# Altium footprint library WE-SHC.PcbLib: 139 footprints (part 5 of 10) (continued)
## 3670448 [mm] "Shielding Cabinet, SMT Frame Seamless, 44.8x18.2x3mm"
height 3
pads (6):
  rect 1x15 smd paste-2539.97 mask-2222: 1(-22.25,0) 1(22.25,0)
  oval 1.5x2.5 hole 0.9 slot 1.7 at 90 deg: 1(-22.25,0) 1(22.25,0)
  rect 20x1 smd paste-2539.97 mask-2222: 1(0,-8.95) 1(0,8.95)
Top Layer:
  region: -23,-7.3 -23,7.3 -23,7.536 -22.908,8 -22.727,8.437 -22.464,8.83 -22.13,9.164 -21.737,9.427 -21.3,9.608 -20.836,9.7 -20.6,9.7 1,9.7 1,8.2 -20.6,8.2 -20.688,8.196 -20.861,8.161 -21.024,8.094 -21.171,7.996 -21.296,7.871 -21.394,7.724 -21.461,7.561 -21.496,7.388 -21.5,7.3 -21.5,-7.3 -21.496,-7.388 -21.461,-7.561 -21.394,-7.724 -21.296,-7.871 -21.171,-7.996 -21.024,-8.094 -20.861,-8.161 -20.688,-8.196 -20.6,-8.2 1,-8.2 1,-9.7 -20.6,-9.7 -20.836,-9.7 -21.3,-9.608 -21.737,-9.427 -22.13,-9.164 -22.464,-8.83 -22.727,-8.437 -22.908,-8 -23,-7.536
  region: 23,-7.3 23,7.3 23,7.536 22.908,8 22.727,8.437 22.464,8.83 22.13,9.164 21.737,9.427 21.3,9.608 20.836,9.7 20.6,9.7 0.25,9.7 0.25,8.2 20.6,8.2 20.688,8.196 20.861,8.161 21.024,8.094 21.171,7.996 21.296,7.871 21.394,7.724 21.461,7.561 21.496,7.388 21.5,7.3 21.5,-7.3 21.496,-7.388 21.461,-7.561 21.394,-7.724 21.296,-7.871 21.171,-7.996 21.024,-8.094 20.861,-8.161 20.688,-8.196 20.6,-8.2 0.25,-8.2 0.25,-9.7 20.6,-9.7 20.836,-9.7 21.3,-9.608 21.737,-9.427 22.13,-9.164 22.464,-8.83 22.727,-8.437 22.908,-8 23,-7.536
Top Paste:
  region: 23,-7.3 23,7.3 23,7.536 22.908,8 22.727,8.437 22.464,8.83 22.13,9.164 21.737,9.427 21.3,9.608 20.836,9.7 20.6,9.7 0.25,9.7 0.25,8.2 20.6,8.2 20.688,8.196 20.861,8.161 21.024,8.094 21.171,7.996 21.296,7.871 21.394,7.724 21.461,7.561 21.496,7.388 21.5,7.3 21.5,-7.3 21.496,-7.388 21.461,-7.561 21.394,-7.724 21.296,-7.871 21.171,-7.996 21.024,-8.094 20.861,-8.161 20.688,-8.196 20.6,-8.2 0.25,-8.2 0.25,-9.7 20.6,-9.7 20.836,-9.7 21.3,-9.608 21.737,-9.427 22.13,-9.164 22.464,-8.83 22.727,-8.437 22.908,-8 23,-7.536
  region: -23,-7.3 -23,7.3 -23,7.536 -22.908,8 -22.727,8.437 -22.464,8.83 -22.13,9.164 -21.737,9.427 -21.3,9.608 -20.836,9.7 -20.6,9.7 -0.25,9.7 -0.25,8.2 -20.6,8.2 -20.688,8.196 -20.861,8.161 -21.024,8.094 -21.171,7.996 -21.296,7.871 -21.394,7.724 -21.461,7.561 -21.496,7.388 -21.5,7.3 -21.5,-7.3 -21.496,-7.388 -21.461,-7.561 -21.394,-7.724 -21.296,-7.871 -21.171,-7.996 -21.024,-8.094 -20.861,-8.161 -20.688,-8.196 -20.6,-8.2 -0.25,-8.2 -0.25,-9.7 -20.6,-9.7 -20.836,-9.7 -21.3,-9.608 -21.737,-9.427 -22.13,-9.164 -22.464,-8.83 -22.727,-8.437 -22.908,-8 -23,-7.536
Notes:
  text "recommended tin paste thickness=0.5mm / customer to define the final stencil gap" at -6.35,-11.5 h0.4
Top Designator:
  text ".Designator" at -7.498,-0.5 h1.5
Top Component Outline:
  lines w0.1: -22.4,-7.35 ccw(c-20.65,-7.35) -20.65,-9.1 20.65,-9.1 ccw(c20.65,-7.35) 22.4,-7.35 22.4,7.35 ccw(c20.65,7.35) 20.65,9.1 -20.65,9.1 ccw(c-20.65,7.35) -22.4,7.35 -22.4,-7.35
Top 3D Body:
  lines w0.1: -22.4,-7.35 ccw(c-20.65,-7.35) -20.65,-9.1 20.65,-9.1 ccw(c20.65,-7.35) 22.4,-7.35 22.4,7.35 ccw(c20.65,7.35) 20.65,9.1 -20.65,9.1 ccw(c-20.65,7.35) -22.4,7.35 -22.4,-7.35
Top Courtyard:
  lines w0.05: -0.5,0 0.5,0 ; 0,-0.5 0,0.5 ; -23.2,-9.9 -23.2,9.9 23.2,9.9 23.2,-9.9 -23.2,-9.9
3D body "3670448.stp": height 3, standoff -0.5, extent -22.4,-9.1 22.4,9.1

## 3670453 [mm] "Shielding Cabinet, SMT Frame Seamless, 45.3x16.2x6mm"
height 6
pads (6):
  rect 1x14 smd paste-2539.97 mask-2222: 1(-22.5,0) 1(22.5,0)
  oval 1.5x2.7 hole 0.8 slot 1.8 at 90 deg: 1(-22.5,0) 1(22.5,0)
  rect 20x1 smd paste-2539.97 mask-2222: 1(0,-7.95) 1(0,7.95)
Top Layer:
  region: -23.25,-6.3 -23.25,6.3 -23.25,6.536 -23.158,7 -22.977,7.437 -22.714,7.83 -22.38,8.164 -21.987,8.427 -21.55,8.608 -21.086,8.7 -20.85,8.7 1,8.7 1,7.2 -20.85,7.2 -20.938,7.196 -21.111,7.161 -21.274,7.094 -21.421,6.996 -21.546,6.871 -21.644,6.724 -21.711,6.561 -21.746,6.388 -21.75,6.3 -21.75,-6.3 -21.746,-6.388 -21.711,-6.561 -21.644,-6.724 -21.546,-6.871 -21.421,-6.996 -21.274,-7.094 -21.111,-7.161 -20.938,-7.196 -20.85,-7.2 1,-7.2 1,-8.7 -20.85,-8.7 -21.086,-8.7 -21.55,-8.608 -21.987,-8.427 -22.38,-8.164 -22.714,-7.83 -22.977,-7.437 -23.158,-7 -23.25,-6.536
  region: 23.25,-6.3 23.25,6.3 23.25,6.536 23.158,7 22.977,7.437 22.714,7.83 22.38,8.164 21.987,8.427 21.55,8.608 21.086,8.7 20.85,8.7 0.25,8.7 0.25,7.2 20.85,7.2 20.938,7.196 21.111,7.161 21.274,7.094 21.421,6.996 21.546,6.871 21.644,6.724 21.711,6.561 21.746,6.388 21.75,6.3 21.75,-6.3 21.746,-6.388 21.711,-6.561 21.644,-6.724 21.546,-6.871 21.421,-6.996 21.274,-7.094 21.111,-7.161 20.938,-7.196 20.85,-7.2 0.25,-7.2 0.25,-8.7 20.85,-8.7 21.086,-8.7 21.55,-8.608 21.987,-8.427 22.38,-8.164 22.714,-7.83 22.977,-7.437 23.158,-7 23.25,-6.536
Top Paste:
  region: 23.25,-6.3 23.25,6.3 23.25,6.536 23.158,7 22.977,7.437 22.714,7.83 22.38,8.164 21.987,8.427 21.55,8.608 21.086,8.7 20.85,8.7 0.25,8.7 0.25,7.2 20.85,7.2 20.938,7.196 21.111,7.161 21.274,7.094 21.421,6.996 21.546,6.871 21.644,6.724 21.711,6.561 21.746,6.388 21.75,6.3 21.75,-6.3 21.746,-6.388 21.711,-6.561 21.644,-6.724 21.546,-6.871 21.421,-6.996 21.274,-7.094 21.111,-7.161 20.938,-7.196 20.85,-7.2 0.25,-7.2 0.25,-8.7 20.85,-8.7 21.086,-8.7 21.55,-8.608 21.987,-8.427 22.38,-8.164 22.714,-7.83 22.977,-7.437 23.158,-7 23.25,-6.536
  region: -23.25,-6.3 -23.25,6.3 -23.25,6.536 -23.158,7 -22.977,7.437 -22.714,7.83 -22.38,8.164 -21.987,8.427 -21.55,8.608 -21.086,8.7 -20.85,8.7 -0.25,8.7 -0.25,7.2 -20.85,7.2 -20.938,7.196 -21.111,7.161 -21.274,7.094 -21.421,6.996 -21.546,6.871 -21.644,6.724 -21.711,6.561 -21.746,6.388 -21.75,6.3 -21.75,-6.3 -21.746,-6.388 -21.711,-6.561 -21.644,-6.724 -21.546,-6.871 -21.421,-6.996 -21.274,-7.094 -21.111,-7.161 -20.938,-7.196 -20.85,-7.2 -0.25,-7.2 -0.25,-8.7 -20.85,-8.7 -21.086,-8.7 -21.55,-8.608 -21.987,-8.427 -22.38,-8.164 -22.714,-7.83 -22.977,-7.437 -23.158,-7 -23.25,-6.536
Notes:
  text "recommended tin paste thickness=0.5mm / customer to define the final stencil gap" at -6.2,-10.25 h0.4
Top Designator:
  text ".Designator" at -7.498,-0.5 h1.5
Top Component Outline:
  lines w0.1: -22.65,-6.35 ccw(c-20.9,-6.35) -20.9,-8.1 20.9,-8.1 ccw(c20.9,-6.35) 22.65,-6.35 22.65,6.35 ccw(c20.9,6.35) 20.9,8.1 -20.9,8.1 ccw(c-20.9,6.35) -22.65,6.35 -22.65,-6.35
Top 3D Body:
  lines w0.1: -22.65,-6.35 ccw(c-20.9,-6.35) -20.9,-8.1 20.9,-8.1 ccw(c20.9,-6.35) 22.65,-6.35 22.65,6.35 ccw(c20.9,6.35) 20.9,8.1 -20.9,8.1 ccw(c-20.9,6.35) -22.65,6.35 -22.65,-6.35
Top Courtyard:
  lines w0.05: -0.5,0 0.5,0 ; 0,-0.5 0,0.5 ; -23.45,-8.9 -23.45,8.9 23.45,8.9 23.45,-8.9 -23.45,-8.9
3D body "3670453.stp": height 6, standoff -1, extent -22.65,-8.1 22.65,8.1

## 3670466 [mm] "Shielding Cabinet, SMT Frame Seamless, 46.6x17.3x5mm"
height 5
pads (4):
  rect 1x14 smd paste-2539.97 mask-2222: 1(-23.15,0) 1(23.15,0)
  rect 20x1 smd paste-2539.97 mask-2222: 1(0,-8.5) 1(0,8.5)
Top Layer:
  region: -23.9,-1 -23.9,6.65 -23.9,6.906 -23.8,7.408 -23.604,7.882 -23.32,8.307 -22.957,8.67 -22.532,8.954 -22.058,9.15 -21.556,9.25 -21.3,9.25 21.3,9.25 21.556,9.25 22.058,9.15 22.532,8.954 22.957,8.67 23.32,8.307 23.604,7.882 23.8,7.408 23.9,6.906 23.9,6.65 23.9,-1 22.4,-1 22.4,6.65 22.395,6.758 22.353,6.969 22.27,7.169 22.15,7.348 21.998,7.5 21.819,7.62 21.619,7.703 21.408,7.745 21.3,7.75 -21.3,7.75 -21.408,7.745 -21.619,7.703 -21.819,7.62 -21.998,7.5 -22.15,7.348 -22.27,7.169 -22.353,6.969 -22.395,6.758 -22.4,6.65 -22.4,-1
  region: -23.9,-0.25 -23.9,-6.65 -23.9,-6.906 -23.8,-7.408 -23.604,-7.882 -23.32,-8.307 -22.957,-8.67 -22.532,-8.954 -22.058,-9.15 -21.556,-9.25 -21.3,-9.25 21.3,-9.25 21.556,-9.25 22.058,-9.15 22.532,-8.954 22.957,-8.67 23.32,-8.307 23.604,-7.882 23.8,-7.408 23.9,-6.906 23.9,-6.65 23.9,-0.25 22.4,-0.25 22.4,-6.65 22.395,-6.758 22.353,-6.969 22.27,-7.169 22.15,-7.348 21.998,-7.5 21.819,-7.62 21.619,-7.703 21.408,-7.745 21.3,-7.75 -21.3,-7.75 -21.408,-7.745 -21.619,-7.703 -21.819,-7.62 -21.998,-7.5 -22.15,-7.348 -22.27,-7.169 -22.353,-6.969 -22.395,-6.758 -22.4,-6.65 -22.4,-0.25
Top Paste:
  region: -23.9,-0.25 -23.9,-6.65 -23.9,-6.906 -23.8,-7.408 -23.604,-7.882 -23.32,-8.307 -22.957,-8.67 -22.532,-8.954 -22.058,-9.15 -21.556,-9.25 -21.3,-9.25 21.3,-9.25 21.556,-9.25 22.058,-9.15 22.532,-8.954 22.957,-8.67 23.32,-8.307 23.604,-7.882 23.8,-7.408 23.9,-6.906 23.9,-6.65 23.9,-0.25 22.4,-0.25 22.4,-6.65 22.395,-6.758 22.353,-6.969 22.27,-7.169 22.15,-7.348 21.998,-7.5 21.819,-7.62 21.619,-7.703 21.408,-7.745 21.3,-7.75 -21.3,-7.75 -21.408,-7.745 -21.619,-7.703 -21.819,-7.62 -21.998,-7.5 -22.15,-7.348 -22.27,-7.169 -22.353,-6.969 -22.395,-6.758 -22.4,-6.65 -22.4,-0.25
  region: -23.9,0.25 -23.9,6.65 -23.9,6.906 -23.8,7.408 -23.604,7.882 -23.32,8.307 -22.957,8.67 -22.532,8.954 -22.058,9.15 -21.556,9.25 -21.3,9.25 21.3,9.25 21.556,9.25 22.058,9.15 22.532,8.954 22.957,8.67 23.32,8.307 23.604,7.882 23.8,7.408 23.9,6.906 23.9,6.65 23.9,0.25 22.4,0.25 22.4,6.65 22.395,6.758 22.353,6.969 22.27,7.169 22.15,7.348 21.998,7.5 21.819,7.62 21.619,7.703 21.408,7.745 21.3,7.75 -21.3,7.75 -21.408,7.745 -21.619,7.703 -21.819,7.62 -21.998,7.5 -22.15,7.348 -22.27,7.169 -22.353,6.969 -22.395,6.758 -22.4,6.65 -22.4,0.25
Notes:
  text "recommended tin paste thickness=0.5mm / customer to define the final stencil gap" at -6.25,-10.9 h0.4
Top Designator:
  text ".Designator" at -7.498,-0.5 h1.5
Top Component Outline:
  lines w0.1: -23.3,-6.65 ccw(c-21.3,-6.65) -21.3,-8.65 21.3,-8.65 ccw(c21.3,-6.65) 23.3,-6.65 23.3,6.65 ccw(c21.3,6.65) 21.3,8.65 -21.3,8.65 ccw(c-21.3,6.65) -23.3,6.65 -23.3,-6.65
Top 3D Body:
  lines w0.1: -23.3,-6.65 ccw(c-21.3,-6.65) -21.3,-8.65 21.3,-8.65 ccw(c21.3,-6.65) 23.3,-6.65 23.3,6.65 ccw(c21.3,6.65) 21.3,8.65 -21.3,8.65 ccw(c-21.3,6.65) -23.3,6.65 -23.3,-6.65
Top Courtyard:
  lines w0.05: -0.5,0 0.5,0 ; 0,-0.5 0,0.5 ; -24.1,-9.45 24.1,-9.45 24.1,9.45 -24.1,9.45 -24.1,-9.45
3D body "3670466.stp": height 5, standoff 0, extent -23.3,-8.65 23.3,8.65

## 3670473 [mm] "Shielding Cabinet, SMT Frame Seamless, 47.3x23.3x5.3mm"
height 5.3
pads (4):
  rect 1x20 smd paste-2539.97 mask-2222: 1(-23.5,0) 1(23.5,0)
  rect 20x1 smd paste-2539.97 mask-2222: 1(0,-11.5) 1(0,11.5)
Top Layer:
  region: -24.25,-0.25 -24.25,-9.65 -24.25,-9.906 -24.15,-10.408 -23.954,-10.882 -23.67,-11.307 -23.307,-11.67 -22.882,-11.954 -22.408,-12.15 -21.906,-12.25 -21.65,-12.25 21.65,-12.25 21.906,-12.25 22.408,-12.15 22.882,-11.954 23.307,-11.67 23.67,-11.307 23.954,-10.882 24.15,-10.408 24.25,-9.906 24.25,-9.65 24.25,-0.25 22.75,-0.25 22.75,-9.65 22.745,-9.758 22.703,-9.969 22.62,-10.169 22.5,-10.348 22.348,-10.5 22.169,-10.62 21.969,-10.703 21.758,-10.745 21.65,-10.75 -21.65,-10.75 -21.758,-10.745 -21.969,-10.703 -22.169,-10.62 -22.348,-10.5 -22.5,-10.348 -22.62,-10.169 -22.703,-9.969 -22.745,-9.758 -22.75,-9.65 -22.75,-0.25
  region: -24.25,-1 -24.25,9.65 -24.25,9.906 -24.15,10.408 -23.954,10.882 -23.67,11.307 -23.307,11.67 -22.882,11.954 -22.408,12.15 -21.906,12.25 -21.65,12.25 21.65,12.25 21.906,12.25 22.408,12.15 22.882,11.954 23.307,11.67 23.67,11.307 23.954,10.882 24.15,10.408 24.25,9.906 24.25,9.65 24.25,-1 22.75,-1 22.75,9.65 22.745,9.758 22.703,9.969 22.62,10.169 22.5,10.348 22.348,10.5 22.169,10.62 21.969,10.703 21.758,10.745 21.65,10.75 -21.65,10.75 -21.758,10.745 -21.969,10.703 -22.169,10.62 -22.348,10.5 -22.5,10.348 -22.62,10.169 -22.703,9.969 -22.745,9.758 -22.75,9.65 -22.75,-1
Top Paste:
  region: -24.25,0.25 -24.25,9.65 -24.25,9.906 -24.15,10.408 -23.954,10.882 -23.67,11.307 -23.307,11.67 -22.882,11.954 -22.408,12.15 -21.906,12.25 -21.65,12.25 21.65,12.25 21.906,12.25 22.408,12.15 22.882,11.954 23.307,11.67 23.67,11.307 23.954,10.882 24.15,10.408 24.25,9.906 24.25,9.65 24.25,0.25 22.75,0.25 22.75,9.65 22.745,9.758 22.703,9.969 22.62,10.169 22.5,10.348 22.348,10.5 22.169,10.62 21.969,10.703 21.758,10.745 21.65,10.75 -21.65,10.75 -21.758,10.745 -21.969,10.703 -22.169,10.62 -22.348,10.5 -22.5,10.348 -22.62,10.169 -22.703,9.969 -22.745,9.758 -22.75,9.65 -22.75,0.25
  region: -24.25,-0.25 -24.25,-9.65 -24.25,-9.906 -24.15,-10.408 -23.954,-10.882 -23.67,-11.307 -23.307,-11.67 -22.882,-11.954 -22.408,-12.15 -21.906,-12.25 -21.65,-12.25 21.65,-12.25 21.906,-12.25 22.408,-12.15 22.882,-11.954 23.307,-11.67 23.67,-11.307 23.954,-10.882 24.15,-10.408 24.25,-9.906 24.25,-9.65 24.25,-0.25 22.75,-0.25 22.75,-9.65 22.745,-9.758 22.703,-9.969 22.62,-10.169 22.5,-10.348 22.348,-10.5 22.169,-10.62 21.969,-10.703 21.758,-10.745 21.65,-10.75 -21.65,-10.75 -21.758,-10.745 -21.969,-10.703 -22.169,-10.62 -22.348,-10.5 -22.5,-10.348 -22.62,-10.169 -22.703,-9.969 -22.745,-9.758 -22.75,-9.65 -22.75,-0.25
Notes:
  text "recommended tin paste thickness=0.5mm / customer to define the final stencil gap" at -5.85,-13.9 h0.4
Top Designator:
  text ".Designator" at -7.498,-0.5 h1.5
Top Component Outline:
  lines w0.1: -23.65,-9.65 ccw(c-21.65,-9.65) -21.65,-11.65 21.65,-11.65 ccw(c21.65,-9.65) 23.65,-9.65 23.65,9.65 ccw(c21.65,9.65) 21.65,11.65 -21.65,11.65 ccw(c-21.65,9.65) -23.65,9.65 -23.65,-9.65
Top 3D Body:
  lines w0.1: -23.65,-9.65 ccw(c-21.65,-9.65) -21.65,-11.65 21.65,-11.65 ccw(c21.65,-9.65) 23.65,-9.65 23.65,9.65 ccw(c21.65,9.65) 21.65,11.65 -21.65,11.65 ccw(c-21.65,9.65) -23.65,9.65 -23.65,-9.65
Top Courtyard:
  lines w0.05: -0.5,0 0.5,0 ; 0,-0.5 0,0.5 ; -24.45,-12.45 24.45,-12.45 24.45,12.45 -24.45,12.45 -24.45,-12.45
3D body "3670473.stp": height 5.3, standoff 0, extent -23.65,-11.65 23.65,11.65

## 3670477 [mm] "Shielding Cabinet, SMT Frame Seamless, 47.7x18.2x4mm"
height 4
pads (6):
  rect 1x15 smd paste-2539.97 mask-2222: 1(-23.7,0) 1(23.7,0)
  oval 2.4x1.5 hole 0.8 slot 1.6 at 0 deg: 1(-11.45,8.95) 1(11.45,-8.95)
  rect 20x1 smd paste-2539.97 mask-2222: 1(0,-8.95) 1(0,8.95)
Top Layer:
  region: -24.45,-1 -24.45,7.5 -24.45,7.717 -24.365,8.142 -24.2,8.542 -23.959,8.902 -23.652,9.209 -23.292,9.45 -22.892,9.615 -22.467,9.7 -22.25,9.7 22.25,9.7 22.467,9.7 22.892,9.615 23.292,9.45 23.652,9.209 23.959,8.902 24.2,8.542 24.365,8.142 24.45,7.717 24.45,7.5 24.45,-1 22.95,-1 22.95,7.5 22.947,7.569 22.92,7.703 22.867,7.83 22.791,7.944 22.694,8.041 22.58,8.117 22.453,8.17 22.319,8.197 22.25,8.2 -22.25,8.2 -22.319,8.197 -22.453,8.17 -22.58,8.117 -22.694,8.041 -22.791,7.944 -22.867,7.83 -22.92,7.703 -22.947,7.569 -22.95,7.5 -22.95,-1
  region: -24.45,-0.25 -24.45,-7.5 -24.45,-7.717 -24.365,-8.142 -24.2,-8.542 -23.959,-8.902 -23.652,-9.209 -23.292,-9.45 -22.892,-9.615 -22.467,-9.7 -22.25,-9.7 22.25,-9.7 22.467,-9.7 22.892,-9.615 23.292,-9.45 23.652,-9.209 23.959,-8.902 24.2,-8.542 24.365,-8.142 24.45,-7.717 24.45,-7.5 24.45,-0.25 22.95,-0.25 22.95,-7.5 22.947,-7.569 22.92,-7.703 22.867,-7.83 22.791,-7.944 22.694,-8.041 22.58,-8.117 22.453,-8.17 22.319,-8.197 22.25,-8.2 -22.25,-8.2 -22.319,-8.197 -22.453,-8.17 -22.58,-8.117 -22.694,-8.041 -22.791,-7.944 -22.867,-7.83 -22.92,-7.703 -22.947,-7.569 -22.95,-7.5 -22.95,-0.25
Top Paste:
  region: -24.45,-0.25 -24.45,-7.5 -24.45,-7.717 -24.365,-8.142 -24.2,-8.542 -23.959,-8.902 -23.652,-9.209 -23.292,-9.45 -22.892,-9.615 -22.467,-9.7 -22.25,-9.7 22.25,-9.7 22.467,-9.7 22.892,-9.615 23.292,-9.45 23.652,-9.209 23.959,-8.902 24.2,-8.542 24.365,-8.142 24.45,-7.717 24.45,-7.5 24.45,-0.25 22.95,-0.25 22.95,-7.5 22.947,-7.569 22.92,-7.703 22.867,-7.83 22.791,-7.944 22.694,-8.041 22.58,-8.117 22.453,-8.17 22.319,-8.197 22.25,-8.2 -22.25,-8.2 -22.319,-8.197 -22.453,-8.17 -22.58,-8.117 -22.694,-8.041 -22.791,-7.944 -22.867,-7.83 -22.92,-7.703 -22.947,-7.569 -22.95,-7.5 -22.95,-0.25
  region: -24.45,0.25 -24.45,7.5 -24.45,7.717 -24.365,8.142 -24.2,8.542 -23.959,8.902 -23.652,9.209 -23.292,9.45 -22.892,9.615 -22.467,9.7 -22.25,9.7 22.25,9.7 22.467,9.7 22.892,9.615 23.292,9.45 23.652,9.209 23.959,8.902 24.2,8.542 24.365,8.142 24.45,7.717 24.45,7.5 24.45,0.25 22.95,0.25 22.95,7.5 22.947,7.569 22.92,7.703 22.867,7.83 22.791,7.944 22.694,8.041 22.58,8.117 22.453,8.17 22.319,8.197 22.25,8.2 -22.25,8.2 -22.319,8.197 -22.453,8.17 -22.58,8.117 -22.694,8.041 -22.791,7.944 -22.867,7.83 -22.92,7.703 -22.947,7.569 -22.95,7.5 -22.95,0.25
Notes:
  text "recommended tin paste thickness=0.5mm / customer to define the final stencil gap" at -5.7,-11.35 h0.4
Top Designator:
  text ".Designator" at -7.498,-0.5 h1.5
Top Component Outline:
  lines w0.1: -23.85,-7.6 ccw(c-22.35,-7.6) -22.35,-9.1 22.35,-9.1 ccw(c22.35,-7.6) 23.85,-7.6 23.85,7.6 ccw(c22.35,7.6) 22.35,9.1 -22.35,9.1 ccw(c-22.35,7.6) -23.85,7.6 -23.85,-7.6
Top 3D Body:
  lines w0.1: -23.85,-7.6 ccw(c-22.35,-7.6) -22.35,-9.1 22.35,-9.1 ccw(c22.35,-7.6) 23.85,-7.6 23.85,7.6 ccw(c22.35,7.6) 22.35,9.1 -22.35,9.1 ccw(c-22.35,7.6) -23.85,7.6 -23.85,-7.6
Top Courtyard:
  lines w0.05: -0.5,0 0.5,0 ; 0,-0.5 0,0.5 ; -24.45,-9.9 -24.45,9.9 24.65,9.9 24.65,-9.9 -24.45,-9.9
3D body "3670477.stp": height 4, standoff -1, extent -23.85,-9.1 23.85,9.1

## 3670483 [mm] "Shielding Cabinet, SMT Frame Seamless, 48.3x44.3x4.4mm"
height 4.4
pads (6):
  round 1.5 hole 1.3: 1(-24,-8.45) 1(24,8.45)
  rect 1x20 smd paste-2539.97 mask-2222: 1(-24,0) 1(24,0)
  rect 20x1 smd paste-2539.97 mask-2222: 1(0,-22) 1(0,22)
Top Layer:
  region: -24.75,-0.25 -24.75,-19.85 -24.75,-20.04 -24.7,-20.417 -24.602,-20.784 -24.457,-21.135 -24.266,-21.465 -24.035,-21.766 -23.766,-22.035 -23.465,-22.266 -23.135,-22.457 -22.784,-22.602 -22.417,-22.7 -22.04,-22.75 -21.85,-22.75 21.85,-22.75 22.04,-22.75 22.417,-22.7 22.784,-22.602 23.135,-22.457 23.465,-22.266 23.766,-22.035 24.035,-21.766 24.266,-21.465 24.457,-21.135 24.602,-20.784 24.7,-20.417 24.75,-20.04 24.75,-19.85 24.75,-0.25 23.25,-0.25 23.25,-19.85 23.243,-19.987 23.19,-20.256 23.085,-20.51 22.932,-20.738 22.738,-20.932 22.51,-21.085 22.256,-21.19 21.987,-21.243 21.85,-21.25 -21.85,-21.25 -21.987,-21.243 -22.256,-21.19 -22.51,-21.085 -22.738,-20.932 -22.932,-20.738 -23.085,-20.51 -23.19,-20.256 -23.243,-19.987 -23.25,-19.85 -23.25,-0.25
  region: -24.75,-1 -24.75,19.85 -24.75,20.04 -24.7,20.417 -24.602,20.784 -24.457,21.135 -24.266,21.465 -24.035,21.766 -23.766,22.035 -23.465,22.266 -23.135,22.457 -22.784,22.602 -22.417,22.7 -22.04,22.75 -21.85,22.75 21.85,22.75 22.04,22.75 22.417,22.7 22.784,22.602 23.135,22.457 23.465,22.266 23.766,22.035 24.035,21.766 24.266,21.465 24.457,21.135 24.602,20.784 24.7,20.417 24.75,20.04 24.75,19.85 24.75,-1 23.25,-1 23.25,19.85 23.243,19.987 23.19,20.256 23.085,20.51 22.932,20.738 22.738,20.932 22.51,21.085 22.256,21.19 21.987,21.243 21.85,21.25 -21.85,21.25 -21.987,21.243 -22.256,21.19 -22.51,21.085 -22.738,20.932 -22.932,20.738 -23.085,20.51 -23.19,20.256 -23.243,19.987 -23.25,19.85 -23.25,-1
Top Paste:
  region: -24.75,0.25 -24.75,19.85 -24.75,20.04 -24.7,20.417 -24.602,20.784 -24.457,21.135 -24.266,21.465 -24.035,21.766 -23.766,22.035 -23.465,22.266 -23.135,22.457 -22.784,22.602 -22.417,22.7 -22.04,22.75 -21.85,22.75 21.85,22.75 22.04,22.75 22.417,22.7 22.784,22.602 23.135,22.457 23.465,22.266 23.766,22.035 24.035,21.766 24.266,21.465 24.457,21.135 24.602,20.784 24.7,20.417 24.75,20.04 24.75,19.85 24.75,0.25 23.25,0.25 23.25,19.85 23.243,19.987 23.19,20.256 23.085,20.51 22.932,20.738 22.738,20.932 22.51,21.085 22.256,21.19 21.987,21.243 21.85,21.25 -21.85,21.25 -21.987,21.243 -22.256,21.19 -22.51,21.085 -22.738,20.932 -22.932,20.738 -23.085,20.51 -23.19,20.256 -23.243,19.987 -23.25,19.85 -23.25,0.25
  region: -24.75,-0.25 -24.75,-19.85 -24.75,-20.04 -24.7,-20.417 -24.602,-20.784 -24.457,-21.135 -24.266,-21.465 -24.035,-21.766 -23.766,-22.035 -23.465,-22.266 -23.135,-22.457 -22.784,-22.602 -22.417,-22.7 -22.04,-22.75 -21.85,-22.75 21.85,-22.75 22.04,-22.75 22.417,-22.7 22.784,-22.602 23.135,-22.457 23.465,-22.266 23.766,-22.035 24.035,-21.766 24.266,-21.465 24.457,-21.135 24.602,-20.784 24.7,-20.417 24.75,-20.04 24.75,-19.85 24.75,-0.25 23.25,-0.25 23.25,-19.85 23.243,-19.987 23.19,-20.256 23.085,-20.51 22.932,-20.738 22.738,-20.932 22.51,-21.085 22.256,-21.19 21.987,-21.243 21.85,-21.25 -21.85,-21.25 -21.987,-21.243 -22.256,-21.19 -22.51,-21.085 -22.738,-20.932 -22.932,-20.738 -23.085,-20.51 -23.19,-20.256 -23.243,-19.987 -23.25,-19.85 -23.25,-0.25
Notes:
  text "recommended tin paste thickness=0.5mm / customer to define the final stencil gap" at -5.85,-24.3 h0.4
Top Designator:
  text ".Designator" at -7.498,-0.5 h1.5
Top Component Outline:
  lines w0.1: -24.15,-19.9 ccw(c-21.9,-19.9) -21.9,-22.15 21.9,-22.15 ccw(c21.9,-19.9) 24.15,-19.9 24.15,19.9 ccw(c21.9,19.9) 21.9,22.15 -21.9,22.15 ccw(c-21.9,19.9) -24.15,19.9 -24.15,-19.9
Top 3D Body:
  lines w0.1: -24.15,-19.9 ccw(c-21.9,-19.9) -21.9,-22.15 21.9,-22.15 ccw(c21.9,-19.9) 24.15,-19.9 24.15,19.9 ccw(c21.9,19.9) 21.9,22.15 -21.9,22.15 ccw(c-21.9,19.9) -24.15,19.9 -24.15,-19.9
Top Courtyard:
  lines w0.05: -0.5,0 0.5,0 ; 0,-0.5 0,0.5 ; -24.95,-22.95 24.95,-22.95 24.95,22.95 -24.95,22.95 -24.95,-22.95
3D body "3670483.stp": height 4.4, standoff -1, extent -24.15,-22.15 24.15,22.15

## 3670511 [mm] "Shielding Cabinet, SMT Frame Seamless, 51.1x25.7x6.5mm"
height 6.5
pads (6):
  rect 1x20 smd paste-2539.97 mask-2222: 1(-25.4,0) 1(25.4,0)
  oval 2.7x1.5 hole 0.8 slot 1.8 at 0 deg: 1(-6.35,-12.7) 1(6.35,12.7)
  rect 20x1 smd paste-2539.97 mask-2222: 1(0,-12.7) 1(0,12.7)
Top Layer:
  region: -26.15,-1 -26.15,9.85 -26.15,10.086 -26.088,10.554 -25.966,11.01 -25.786,11.446 -25.55,11.854 -25.262,12.229 -24.929,12.562 -24.554,12.85 -24.146,13.086 -23.71,13.266 -23.254,13.388 -22.786,13.45 -22.55,13.45 22.55,13.45 22.786,13.45 23.254,13.388 23.71,13.266 24.146,13.086 24.554,12.85 24.929,12.562 25.262,12.229 25.55,11.854 25.786,11.446 25.966,11.01 26.088,10.554 26.15,10.086 26.15,9.85 26.15,-1 24.65,-1 24.65,9.85 24.64,10.056 24.56,10.46 24.402,10.84 24.173,11.182 23.882,11.473 23.54,11.702 23.16,11.86 22.756,11.94 22.55,11.95 -22.55,11.95 -22.756,11.94 -23.16,11.86 -23.54,11.702 -23.882,11.473 -24.173,11.182 -24.402,10.84 -24.56,10.46 -24.64,10.056 -24.65,9.85 -24.65,-1
  region: -26.15,-0.25 -26.15,-9.85 -26.15,-10.086 -26.088,-10.554 -25.966,-11.01 -25.786,-11.446 -25.55,-11.854 -25.262,-12.229 -24.929,-12.562 -24.554,-12.85 -24.146,-13.086 -23.71,-13.266 -23.254,-13.388 -22.786,-13.45 -22.55,-13.45 22.55,-13.45 22.786,-13.45 23.254,-13.388 23.71,-13.266 24.146,-13.086 24.554,-12.85 24.929,-12.562 25.262,-12.229 25.55,-11.854 25.786,-11.446 25.966,-11.01 26.088,-10.554 26.15,-10.086 26.15,-9.85 26.15,-0.25 24.65,-0.25 24.65,-9.85 24.64,-10.056 24.56,-10.46 24.402,-10.84 24.173,-11.182 23.882,-11.473 23.54,-11.702 23.16,-11.86 22.756,-11.94 22.55,-11.95 -22.55,-11.95 -22.756,-11.94 -23.16,-11.86 -23.54,-11.702 -23.882,-11.473 -24.173,-11.182 -24.402,-10.84 -24.56,-10.46 -24.64,-10.056 -24.65,-9.85 -24.65,-0.25
Top Paste:
  region: -26.15,-0.25 -26.15,-9.85 -26.15,-10.086 -26.088,-10.554 -25.966,-11.01 -25.786,-11.446 -25.55,-11.854 -25.262,-12.229 -24.929,-12.562 -24.554,-12.85 -24.146,-13.086 -23.71,-13.266 -23.254,-13.388 -22.786,-13.45 -22.55,-13.45 22.55,-13.45 22.786,-13.45 23.254,-13.388 23.71,-13.266 24.146,-13.086 24.554,-12.85 24.929,-12.562 25.262,-12.229 25.55,-11.854 25.786,-11.446 25.966,-11.01 26.088,-10.554 26.15,-10.086 26.15,-9.85 26.15,-0.25 24.65,-0.25 24.65,-9.85 24.64,-10.056 24.56,-10.46 24.402,-10.84 24.173,-11.182 23.882,-11.473 23.54,-11.702 23.16,-11.86 22.756,-11.94 22.55,-11.95 -22.55,-11.95 -22.756,-11.94 -23.16,-11.86 -23.54,-11.702 -23.882,-11.473 -24.173,-11.182 -24.402,-10.84 -24.56,-10.46 -24.64,-10.056 -24.65,-9.85 -24.65,-0.25
  region: -26.15,0.25 -26.15,9.85 -26.15,10.086 -26.088,10.554 -25.966,11.01 -25.786,11.446 -25.55,11.854 -25.262,12.229 -24.929,12.562 -24.554,12.85 -24.146,13.086 -23.71,13.266 -23.254,13.388 -22.786,13.45 -22.55,13.45 22.55,13.45 22.786,13.45 23.254,13.388 23.71,13.266 24.146,13.086 24.554,12.85 24.929,12.562 25.262,12.229 25.55,11.854 25.786,11.446 25.966,11.01 26.088,10.554 26.15,10.086 26.15,9.85 26.15,0.25 24.65,0.25 24.65,9.85 24.64,10.056 24.56,10.46 24.402,10.84 24.173,11.182 23.882,11.473 23.54,11.702 23.16,11.86 22.756,11.94 22.55,11.95 -22.55,11.95 -22.756,11.94 -23.16,11.86 -23.54,11.702 -23.882,11.473 -24.173,11.182 -24.402,10.84 -24.56,10.46 -24.64,10.056 -24.65,9.85 -24.65,0.25
Notes:
  text "recommended tin paste thickness=0.5mm / customer to define the final stencil gap" at -6.3,-15.4 h0.4
Top Designator:
  text ".Designator" at -7.498,-0.5 h1.5
Top Component Outline:
  lines w0.1: -25.55,-9.85 ccw(c-22.55,-9.85) -22.55,-12.85 22.55,-12.85 ccw(c22.55,-9.85) 25.55,-9.85 25.55,9.85 ccw(c22.55,9.85) 22.55,12.85 -22.55,12.85 ccw(c-22.55,9.85) -25.55,9.85 -25.55,-9.85
Top 3D Body:
  lines w0.1: -25.55,-9.85 ccw(c-22.55,-9.85) -22.55,-12.85 22.55,-12.85 ccw(c22.55,-9.85) 25.55,-9.85 25.55,9.85 ccw(c22.55,9.85) 22.55,12.85 -22.55,12.85 ccw(c-22.55,9.85) -25.55,9.85 -25.55,-9.85
Top Courtyard:
  lines w0.05: -0.5,0 0.5,0 ; 0,-0.5 0,0.5 ; -26.35,-13.65 26.35,-13.65 26.35,13.65 -26.35,13.65 -26.35,-13.65
3D body "3670511.stp": height 6.5, standoff -0.6, extent -25.55,-12.85 25.55,12.85